# Altium footprint library THU.PcbLib: 477 footprints (part 19 of 30)
Each footprint in its own frame and in the unit in brackets; x right, y up, seen from the top. Pads: shape width x height; smd on the part's side, far side on the other; paste and mask are expansions set on the pad; w line width, h text height; cw(c..) or ccw(c..) is an arc to the next point about the centre after c.
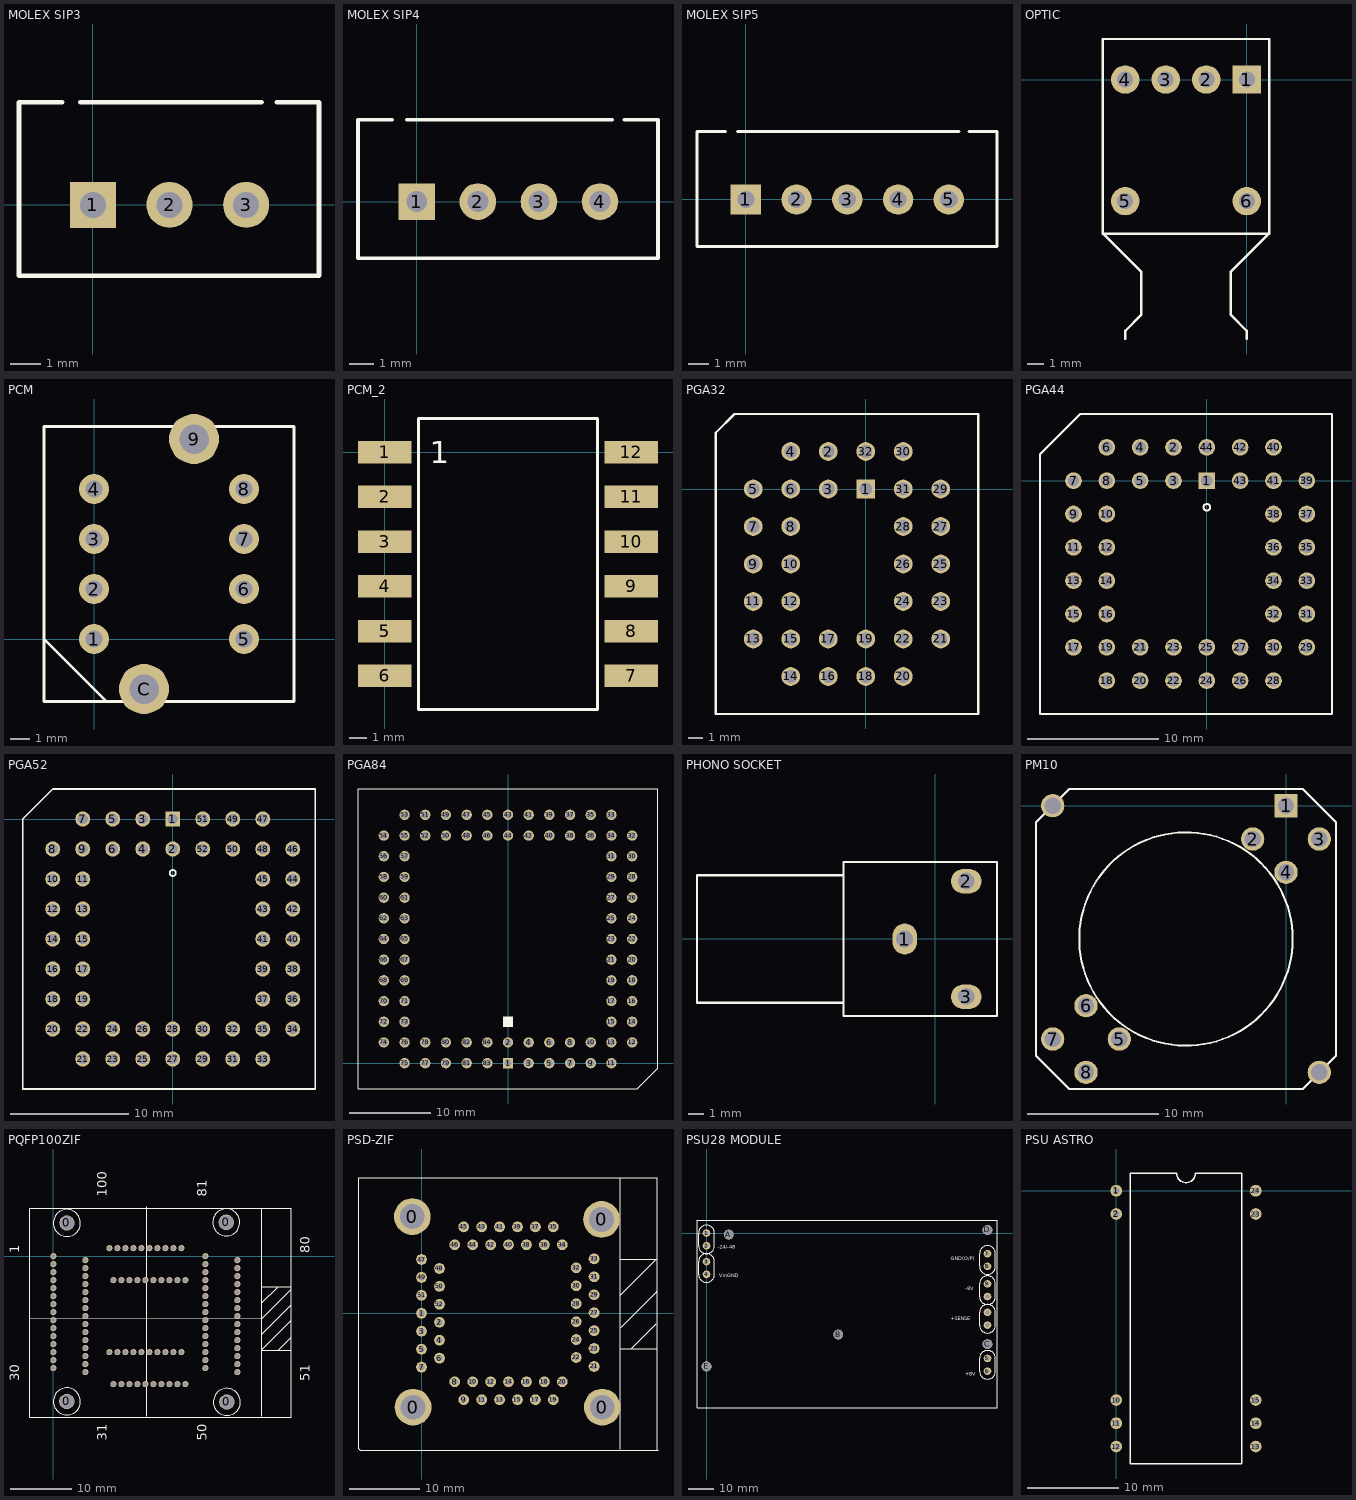
[diagram p18: the footprints below, top view; thin cyan lines are the x and y axes]

## MOLEX SIP3 [mil]
pads (3):
  rect 60x60 hole 34: 1(0,0)
  round 60 hole 34: 2(100,0) 3(200,0)
TopOverlay:
  lines w6: -40,133.86 -96.34,133.86 -96.34,-92.52 295,-92.52 295,133.86 240,133.86 ; -16.34,133.86 220,133.86

## MOLEX SIP4 [mil]
pads (4):
  rect 60x60 hole 34: 1(0,0)
  round 60 hole 34: 2(100,0) 3(200,0) 4(300,0)
TopOverlay:
  lines w6: -40,133.86 -96.34,133.86 -96.34,-92.52 395,-92.52 395,133.86 340,133.86 ; -16.34,133.86 320,133.86

## MOLEX SIP5 [mil]
pads (5):
  rect 60x60 hole 34: 1(0,0)
  round 60 hole 34: 2(100,0) 3(200,0) 4(300,0) 5(400,0)
TopOverlay:
  lines w6: -40,133.86 -96.34,133.86 -96.34,-92.52 495,-92.52 495,133.86 440,133.86 ; -16.34,133.86 420,133.86

## OPTIC [mil]
pads (6):
  rect 70x70 hole 39.37: 1(0,0)
  round 70 hole 39.37: 2(-100,0) 3(-200,0) 4(-300,0) 5(-300,-300) 6(0,-300)
TopOverlay:
  lines w6: -300,-640 -300,-620 -260,-580 -260,-475 -355,-380 ; 0,-640 0,-620 -40,-580 -40,-475 55,-380 ; -355,-380 -355,100 55,100 55,-380 ; -355,-380 55,-380

## PCM [mil]
pads (10):
  round 60 hole 34: 1(0,0) 2(0,100) 3(0,200) 4(0,300) 5(300,0) 6(300,100) 7(300,200) 8(300,300)
  round 100 hole 59: 9(200,400) C(100,-100)
TopOverlay:
  lines w6: -100,0 25,-125 ; -100,-125 400,-125 400,425 -100,425 -100,-125

## PCM_2 [mil]
pads (12):
  rect 120x50 smd: 1(0,0) 2(0,-100) 3(0,-200) 4(0,-300) 5(0,-400) 6(0,-500) 7(550,-500) 8(550,-400) 9(550,-300) 10(550,-200) 11(550,-100) 12(550,0)
TopOverlay:
  lines w6: 75,-575 75,75 475,75 475,-575 75,-575
  text "1" at 100,-25 h50

## PGA32 [mil]
pads (32):
  rect 50x50 hole 34: 1(0,0)
  round 50 hole 34: 2(-100,100) 3(-100,0) 4(-200,100) 5(-300,0) 6(-200,0) 7(-300,-100) 8(-200,-100) 9(-300,-200) 10(-200,-200) 11(-300,-300) 12(-200,-300) 13(-300,-400) 14(-200,-500) 15(-200,-400) 16(-100,-500) 17(-100,-400) 18(0,-500) 19(0,-400) 20(100,-500) 21(200,-400) 22(100,-400) 23(200,-300) 24(100,-300) 25(200,-200) 26(100,-200) 27(200,-100) 28(100,-100) 29(200,0) 30(100,100) 31(100,0) 32(0,100)
TopOverlay:
  lines w6: -400,-600 -400,150 -350,200 300,200 300,-600 -400,-600

## PGA44 [mil]
pads (44):
  rect 50x50 hole 34: 1(0,0)
  round 50 hole 34: 2(-100,100) 3(-100,0) 4(-200,100) 5(-200,0) 6(-300,100) 7(-400,0) 8(-300,0) 9(-400,-100) 10(-300,-100) 11(-400,-200) 12(-300,-200) 13(-400,-300) 14(-300,-300) 15(-400,-400) 16(-300,-400) 17(-400,-500) 18(-300,-600) 19(-300,-500) 20(-200,-600) 21(-200,-500) 22(-100,-600) 23(-100,-500) 24(0,-600) 25(0,-500) 26(100,-600) 27(100,-500) 28(200,-600) 29(300,-500) 30(200,-500) 31(300,-400) 32(200,-400) 33(300,-300) 34(200,-300) 35(300,-200) 36(200,-200) 37(300,-100) 38(200,-100) 39(300,0) 40(200,100) 41(200,0) 42(100,100) 43(100,0) 44(0,100)
TopOverlay:
  circle w6: c0,-80 r10
  lines w6: -500,-700 375,-700 375,200 -380,200 -500,80 -500,-700

## PGA52 [mil]
pads (52):
  rect 50x50 hole 34: 1(0,0)
  round 50 hole 34: 2(0,-100) 3(-100,0) 4(-100,-100) 5(-200,0) 6(-200,-100) 7(-300,0) 8(-400,-100) 9(-300,-100) 10(-400,-200) 11(-300,-200) 12(-400,-300) 13(-300,-300) 14(-400,-400) 15(-300,-400) 16(-400,-500) 17(-300,-500) 18(-400,-600) 19(-300,-600) 20(-400,-700) 21(-300,-800) 22(-300,-700) 23(-200,-800) 24(-200,-700) 25(-100,-800) 26(-100,-700) 27(0,-800) 28(0,-700) 29(100,-800) 30(100,-700) 31(200,-800) 32(200,-700) 33(300,-800) 34(400,-700) 35(300,-700) 36(400,-600) 37(300,-600) 38(400,-500) 39(300,-500) 40(400,-400) 41(300,-400) 42(400,-300) 43(300,-300) 44(400,-200) 45(300,-200) 46(400,-100) 47(300,0) 48(300,-100) 49(200,0) 50(200,-100) 51(100,0) 52(100,-100)
TopOverlay:
  circle w6: c0,-180 r10
  lines w6: -500,-900 475,-900 475,100 -400,100 -500,0 -500,-900

## PGA84 [mil]
pads (84):
  rect 50x50 hole 34: 1(0,0)
  round 50 hole 34: 2(0,100) 3(100,0) 4(100,100) 5(200,0) 6(200,100) 7(300,0) 8(300,100) 9(400,0) 10(400,100) 11(500,0) 12(600,100) 13(500,100) 14(600,200) 15(500,200) 16(600,300) 17(500,300) 18(600,400) 19(500,400) 20(600,500) 21(500,500) 22(600,600) 23(500,600) 24(600,700) 25(500,700) 26(600,800) 27(500,800) 28(600,900) 29(500,900) 30(600,1000) 31(500,1000) 32(600,1100) 33(500,1200) 34(500,1100) 35(400,1200) 36(400,1100) 37(300,1200) 38(300,1100) 39(200,1200) 40(200,1100) 41(100,1200) 42(100,1100) 43(0,1200) 44(0,1100) 45(-100,1200) 46(-100,1100) 47(-200,1200) 48(-200,1100) 49(-300,1200) 50(-300,1100) 51(-400,1200) 52(-400,1100) 53(-500,1200) 54(-600,1100) 55(-500,1100) 56(-600,1000) 57(-500,1000) 58(-600,900) 59(-500,900) 60(-600,800) 61(-500,800) 62(-600,700) 63(-500,700) 64(-600,600) 65(-500,600) 66(-600,500) 67(-500,500) 68(-600,400) 69(-500,400) 70(-600,300) 71(-500,300) 72(-600,200) 73(-500,200) 74(-600,100) 75(-500,0) 76(-500,100) 77(-400,0) 78(-400,100) 79(-300,0) 80(-300,100) 81(-200,0) 82(-200,100) 83(-100,0) 84(-100,100)
TopOverlay:
  rectangle: -25,175 25,225
  lines w6: -725,-125 -725,1325 725,1325 725,-25 625,-125 -725,-125

## PHONO SOCKET [mm] "RCA PHONO SOCKET"
height 11
pads (3):
  oval 1.6x2 hole 1.1 unplated: 1(-2,-0.005)
  oval 2x1.6 hole 1.1 unplated: 2(2,3.755) 3(2,-3.755)
TopOverlay:
  lines w0.152: -5.985,-4.155 -15.5,-4.155 -15.5,4.145 -5.985,4.145 ; -5.975,-0.03 -5.975,-5.005 4,-5.005 ; -5.975,-0.005 -5.975,4.995 4,4.995 ; 4,-4.986 4,-0.005 4,4.977

## PM10 [mil]
pads (10):
  rect 70x70 hole 49: 1(0,0)
  round 70 hole 49: 2(-100,-100) 3(100,-100) 4(0,-200) 5(-500,-700) 6(-600,-600) 7(-700,-700) 8(-600,-800) ""(-700,0) ""(100,-800)
TopOverlay:
  circle w6: c-300,-400 r320.16
  lines w6: -750,-750 -650,-850 50,-850 150,-750 150,-50 50,50 -650,50 -750,-50 -750,-750

## PQFP100ZIF [mm]
pads (104):
  round 2.5 hole 2.3: 0(2.194,-23.613) 0(2.2,5.4) 0(28.1,5.5) 0(28.2,-23.7)
  round 1 hole 0.7: 1(0,0) 2(5.2,-0.65) 3(0,-1.3) 4(5.2,-1.95) 5(0,-2.6) 6(5.2,-3.25) 7(0,-3.9) 8(5.2,-4.55) 9(0,-5.2) 10(5.2,-5.85) 11(0,-6.5) 12(5.2,-7.15) 13(0,-7.8) 14(5.2,-8.45) 15(0,-9.1) 16(5.2,-9.75) 17(0,-10.4) 18(5.2,-11.05) 19(0,-11.7) 20(5.2,-12.35) 21(0,-13) 22(5.2,-13.65) 23(0,-14.3) 24(5.2,-14.95) 25(0,-15.6) 25(5.2,-16.25) 27(0,-16.9) 29(0,-18.2) 30(5.2,-18.85) 31(9.1,-15.6) 32(9.75,-20.8) 33(10.4,-15.6) 34(11.05,-20.8) 35(11.7,-15.6) 36(12.35,-20.8) 37(13,-15.6) 38(13.65,-20.8) 39(14.3,-15.6) 40(14.95,-20.8) 41(15.6,-15.6) 42(16.25,-20.8) 43(16.9,-15.6) 44(17.55,-20.8) 45(18.2,-15.6) 46(18.85,-20.8) 47(19.5,-15.6) 48(20.15,-20.8) 49(20.8,-15.6) 50(21.45,-20.8) 51(29.9,-18.85) 52(24.7,-18.2) 53(29.9,-17.55) 54(24.7,-16.9) 55(29.9,-16.25) 56(24.7,-15.6) 57(29.9,-14.95) 58(24.7,-14.3) 59(29.9,-13.65) 60(24.7,-13) 61(29.9,-12.35) 62(24.7,-11.7) 63(29.9,-11.05) 64(24.7,-10.4) 65(29.9,-9.75) 66(24.7,-9.1) 67(29.9,-8.45) 68(24.7,-7.8) 69(29.9,-7.15) 70(24.7,-6.5) 71(29.9,-5.85) 72(24.7,-5.2) 73(29.9,-4.55) 74(24.7,-3.9) 75(29.9,-3.25) 76(24.7,-2.6) 77(29.9,-1.95) 78(24.7,-1.3) 79(29.9,-0.65) 80(24.7,0) 81(21.45,-3.9) 82(20.8,1.3) 83(20.15,-3.9) 84(19.5,1.3) 85(18.85,-3.9) 86(18.2,1.3) 87(17.55,-3.9) 88(16.9,1.3) 89(16.25,-3.9) 90(15.6,1.3) 91(14.95,-3.9) 92(14.3,1.3) 93(13.65,-3.9) 94(13,1.3) 95(12.35,-3.9) 96(11.7,1.3) 97(11.05,-3.9) 98(10.4,1.3) 99(9.75,-3.9) 100(9.1,1.3)
  round 1.016 hole 0.7: 28(5.2,-17.55)
TopOverlay:
  lines w0.152: -3.8,-10.1 33.909,-9.982 ; 4.398,-23.515 ccw(c2.2,-23.6) 4.4,-23.6 ; 4.398,5.485 ccw(c2.2,5.4) 4.4,5.4 ; 15.2,-26 15.2,8 ; 30.298,5.585 ccw(c28.1,5.5) 30.3,5.5 ; 30.398,-23.615 ccw(c28.2,-23.7) 30.4,-23.7 ; 33.9,-26 33.9,7.7 ; 33.9,-15.3 38.6,-15.3 ; 33.9,-15.164 33.9,-15.189 38.675,-10.414 38.7,-10.414 ; 33.9,-12.7 38.675,-7.925 38.7,-7.925 ; 33.9,-10.135 38.7,-5.335 38.7,-5.258 ; 33.9,-7.544 33.9,-7.595 36.474,-5.02 ; 33.9,-5 38.7,-5 ; 36.525,-15.3 36.576,-15.3 38.592,-13.284 38.7,-13.284 ; -3.8,-26.2 38.7,-26.2 38.7,7.8 -3.8,7.8 -3.8,-26.2
  text "1" at -5.588,0.508 h1.52
  text "30" at -5.588,-20.32 h1.52
  text "31" at 8.636,-29.972 h1.52
  text "50" at 24.892,-29.972 h1.52
  text "51" at 41.656,-20.32 h1.52
  text "80" at 41.656,0.508 h1.52
  text "81" at 24.892,9.652 h1.52
  text "100" at 8.636,9.652 h1.52

## PSD-ZIF [mil]
pads (56):
  round 204.72 hole 137.79: 0(-51.18,539.37) 0(-47.24,-523.62) 0(1003.94,523.62) 0(1007.87,-523.62)
  round 60 hole 34: 1(0,0) 2(100,-50) 3(0,-100) 4(100,-150) 5(0,-200) 6(100,-250) 7(0,-300) 8(185.2,-381.89) 9(235.2,-481.89) 10(285.2,-381.89) 11(335.2,-481.89) 12(385.2,-381.89) 13(435.2,-481.89) 14(485.2,-381.89) 15(535.2,-481.89) 16(585.2,-381.89) 17(635.2,-481.89) 18(685.2,-381.89) 19(735.2,-481.89) 20(785.2,-381.89) 21(962.4,-296.54) 22(862.4,-246.53) 23(962.4,-196.53) 24(862.4,-146.53) 25(962.4,-96.53) 26(862.4,-46.53) 27(962.4,3.46) 28(862.4,53.47) 29(962.4,103.47) 30(862.4,153.47) 31(962.4,203.47) 32(862.4,253.47) 33(962.4,303.46) 34(785.2,381.89) 35(735.2,481.89) 36(685.2,381.89) 37(635.2,481.89) 38(585.2,381.89) 39(535.2,481.89) 40(485.2,381.89) 41(435.2,481.89) 42(385.2,381.89) 43(335.2,481.89) 44(285.2,381.89) 45(235.2,481.89) 46(185.2,381.89) 47(0,300) 48(100,250) 49(0,200) 50(100,150) 51(0,100) 52(100,50)
TopOverlay:
  lines w6: 1109.13,-758.11 1109.13,755.91 ; 1109.13,-198.11 1309.13,-198.11 ; 1109.13,101.89 1309.13,301.89 1314.96,301.89 1109.13,301.89 ; 1114.96,-78.11 1314.96,121.89 1309.13,121.89 ; 1169.13,-198.11 1309.13,-58.11 ; -354.33,755.91 -350.39,751.97 -350.39,-755.9 -342.52,-763.78 1318.9,-763.78 1314.96,-759.84 1314.96,755.91 -354.33,755.91

## PSU28 MODULE [mil]
pads (17):
  round 120 hole 59: 1(0,0) 2(0,-200) 3(0,-450) 4(0,-650) 5(4425,-1975) 6(4425,-2175) 7(4425,-325) 8(4425,-525) 9(4425,-800) 10(4425,-1000) 11(4425,-1250) 12(4425,-1450)
  round 154 hole 154: A(350,-25) B(2075,-1600) C(4425,-1750) D(4425,50) E(0,-2100)
TopOverlay:
  lines w6: -150,-2750 4575,-2750 4575,200 -150,200 -150,-2750 ; -125,-650 ccw(c0,-650) 125,-650 125,-450 ccw(c0,-450) -125,-450 -125,-650 ; -125,-200 ccw(c0,-200) 125,-200 125,0 ccw(c0,0) -125,0 -125,-200 ; 4300,-2175 ccw(c4425,-2175) 4550,-2175 4550,-1975 ccw(c4425,-1975) 4300,-1975 4300,-2175 ; 4300,-1450 ccw(c4425,-1450) 4550,-1450 4550,-1250 ccw(c4425,-1250) 4300,-1250 4300,-1450 ; 4300,-1000 ccw(c4425,-1000) 4550,-1000 4550,-800 ccw(c4425,-800) 4300,-800 4300,-1000 ; 4300,-525 ccw(c4425,-525) 4550,-525 4550,-325 ccw(c4425,-325) 4300,-325 4300,-525
  text "GND(O/P)" at 3850,-425 h60
  text "-8V" at 4075,-900 h60
  text "+8V" at 4075,-2250 h60
  text "SO" at 4375,-1775 h60
  text "SO" at 4375,25 h60
  text "SO" at 2025,-1625 h60
  text "SO" at -50,-2125 h60
  text "SO" at 300,-50 h60
  text "-24/-48" at 175,-250 h60
  text "VinGND" at 200,-700 h60
  text "+SENSE" at 3850,-1375 h60

## PSU ASTRO [mil]
pads (10):
  round 50 hole 28: 1(0,0) 2(0,-100) 10(0,-900) 11(0,-1000) 12(0,-1100) 13(600,-1100) 14(600,-1000) 15(600,-900) 23(600,-100) 24(600,0)
TopOverlay:
  lines w6: 60,-1175 60,75 260,75 ccw(c300,75) 340,75 540,75 540,-1175 60,-1175